# Altium footprint library AI.PcbLib: 137 footprints (part 6 of 9)
Each footprint in its own frame and in the unit in brackets; x right, y up, seen from the top. Pads: shape width x height; smd on the part's side, far side on the other; paste and mask are expansions set on the pad; w line width, h text height; cw(c..) or ccw(c..) is an arc to the next point about the centre after c.
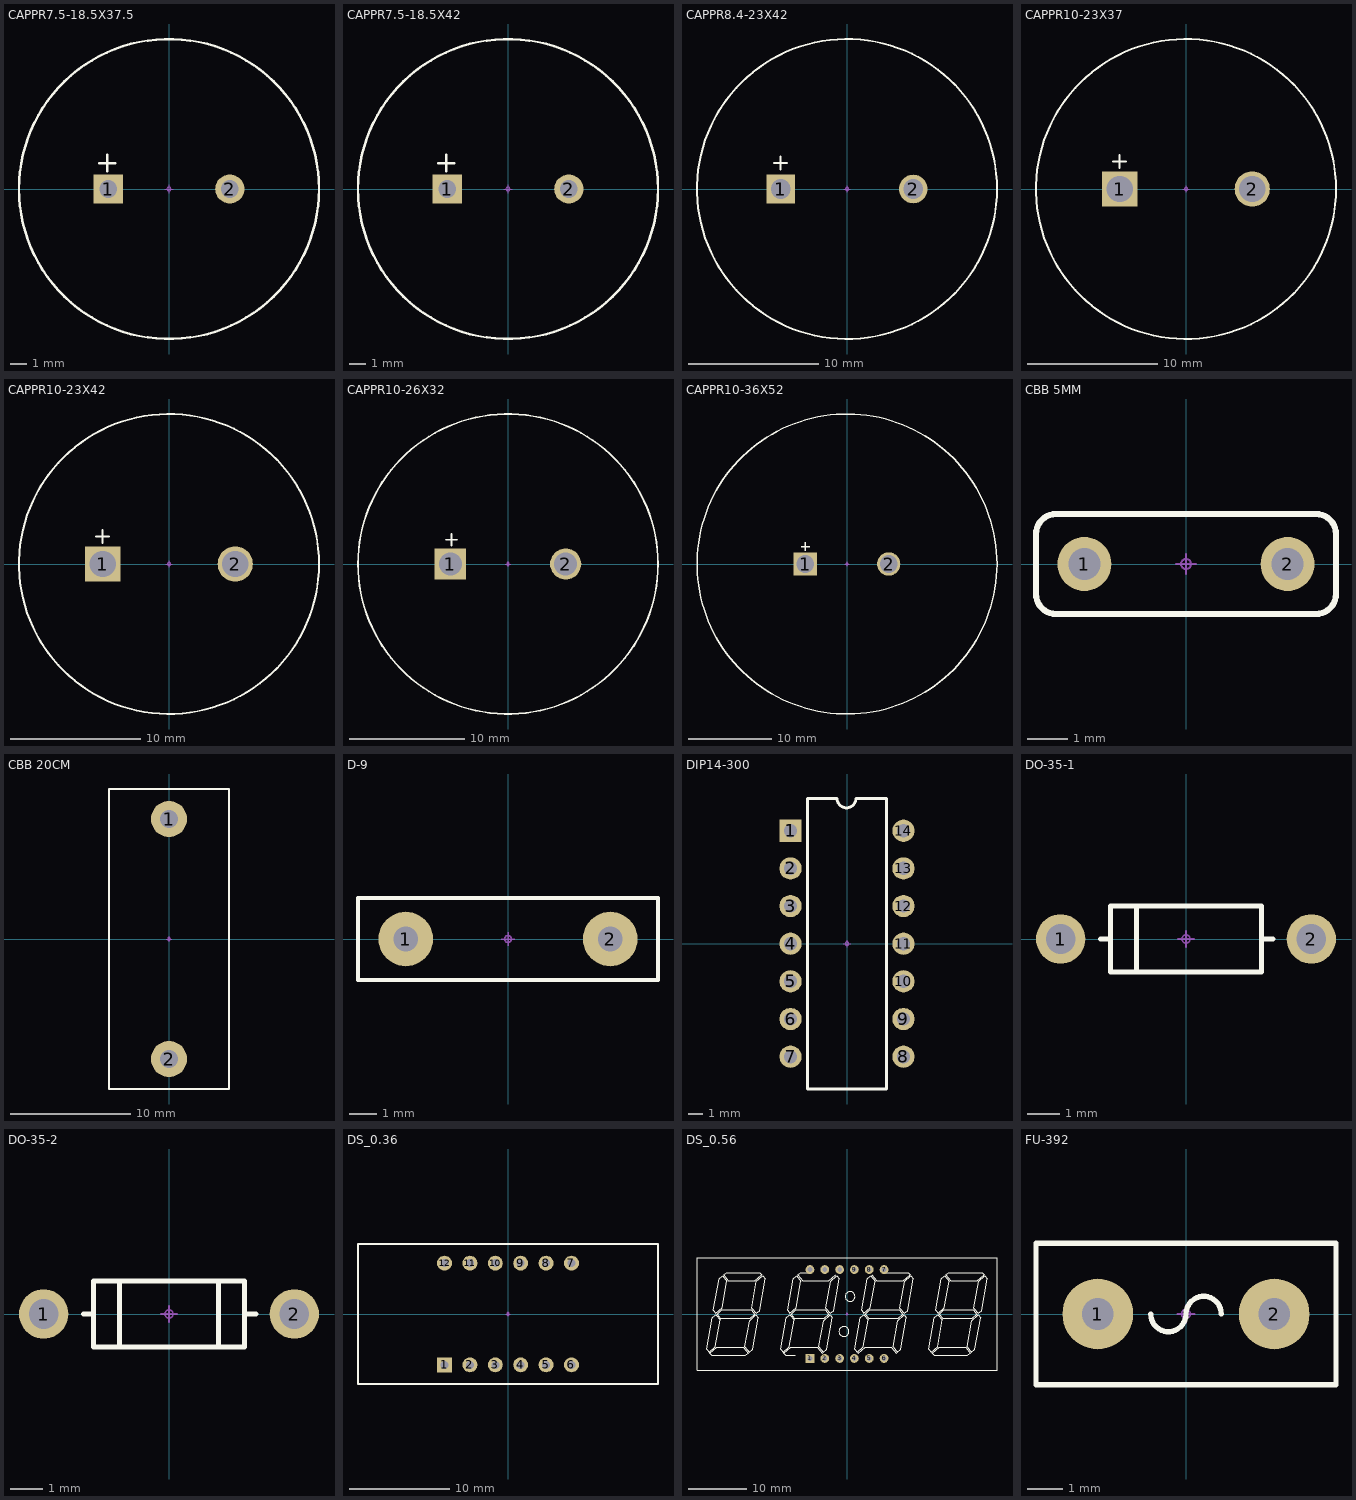
[diagram p5: the footprints below, top view; thin cyan lines are the x and y axes]

## CAPPR7.5-18.5X37.5 [mm]
pads (2):
  rect 1.8x1.8 hole 1.1: 1(-3.75,0)
  round 1.8 hole 1.1: 2(3.75,0)
Top Overlay:
  circle w0.152: c0,0 r9.25
  lines w0.152: -4.3,1.6 -3.3,1.6 ; -3.8,1.1 -3.8,2.1
Mechanical 15:
  circle w0.05: c0,0 r0.125
  lines w0.05: -0.25,0 0.25,0 ; 0,-0.25 0,0.25
3D body "CAPPR750-1850X3750.stp": height 37.5, standoff -3.6, extent -9.25,-9.25 9.25,9.25

## CAPPR7.5-18.5X42 [mm]
pads (2):
  rect 1.8x1.8 hole 1.1: 1(-3.75,0)
  round 1.8 hole 1.1: 2(3.75,0)
Top Overlay:
  circle w0.152: c0,0 r9.25
  lines w0.152: -4.3,1.6 -3.3,1.6 ; -3.8,1.1 -3.8,2.1
Mechanical 15:
  circle w0.05: c0,0 r0.125
  lines w0.05: -0.25,0 0.25,0 ; 0,-0.25 0,0.25
3D body "CAPPR750-1850X4200.stp": height 42, standoff -3.6, extent -9.25,-9.226 9.25,9.274

## CAPPR8.4-23X42 [mm]
pads (2):
  rect 2.2x2.2 hole 1.5: 1(-5.08,0)
  round 2.2 hole 1.5: 2(5.08,0)
Top Overlay:
  circle w0.152: c0,0 r11.5
  lines w0.152: -5.6,2 -4.6,2 ; -5.1,1.5 -5.1,2.5
Mechanical 15:
  circle w0.05: c0,0 r0.125
  lines w0.05: -0.25,0 0.25,0 ; 0,-0.25 0,0.25
3D body "CAPPR1000-2300X4200.stp": height 42, standoff -4, extent -11.5,-11.5 11.5,11.5

## CAPPR10-23X37 [mm]
pads (2):
  rect 2.7x2.7 hole 2: 1(-5.08,0)
  round 2.7 hole 2: 2(5.08,0)
Top Overlay:
  circle w0.152: c0,0 r11.5
  lines w0.152: -5.6,2.1 -4.6,2.1 ; -5.1,1.6 -5.1,2.6
Mechanical 15:
  circle w0.05: c0,0 r0.125
  lines w0.05: -0.25,0 0.25,0 ; 0,-0.25 0,0.25
3D body "CAPPR1000-2300X3700.stp": height 37, standoff -4, extent -11.5,-11.5 11.5,11.5

## CAPPR10-23X42 [mm]
pads (2):
  rect 2.7x2.7 hole 2: 1(-5.08,0)
  round 2.7 hole 2: 2(5.08,0)
Top Overlay:
  circle w0.152: c0,0 r11.5
  lines w0.152: -5.6,2.1 -4.6,2.1 ; -5.1,1.6 -5.1,2.6
Mechanical 15:
  circle w0.05: c0,0 r0.125
  lines w0.05: -0.25,0 0.25,0 ; 0,-0.25 0,0.25
3D body "CAPPR1000-2300X4200.stp": height 42, standoff -4, extent -11.5,-11.5 11.5,11.5

## CAPPR10-26X32 [mm]
pads (2):
  rect 2.7x2.7 hole 2: 1(-5,0)
  round 2.7 hole 2: 2(5,0)
Top Overlay:
  circle w0.152: c0,0 r13
  lines w0.152: -5.4,2.1 -4.4,2.1 ; -4.9,1.6 -4.9,2.6
Mechanical 15:
  circle w0.05: c0,0 r0.125
  lines w0.05: -0.25,0 0.25,0 ; 0,-0.25 0,0.25
3D body "CAPPR1000-2600X3200.stp": height 32, standoff -4, extent -13,-13 13,13

## CAPPR10-36X52 [mm]
pads (2):
  rect 2.8x2.8 hole 2.1: 1(-5,0)
  round 2.8 hole 2.1: 2(5,0)
Top Overlay:
  circle w0.152: c0,0 r18
  lines w0.152: -5.5,2.1 -4.5,2.1 ; -5,1.6 -5,2.6
Mechanical 15:
  circle w0.05: c0,0 r0.125
  lines w0.05: -0.25,0 0.25,0 ; 0,-0.25 0,0.25
3D body "CAPPR1000-3600X5200.stp": height 52, standoff -4, extent -18,-18 18,18

## CBB 5MM [mm]
pads (2):
  round 1.35 hole 0.8: 1(-2.54,0) 2(2.54,0)
Top Overlay:
  lines w0.152: -3.75,-0.75 ccw(c-3.25,-0.75) -3.25,-1.25 3.25,-1.25 ccw(c3.25,-0.75) 3.75,-0.75 3.75,0.75 ccw(c3.25,0.75) 3.25,1.25 -3.25,1.25 ccw(c-3.25,0.75) -3.75,0.75 -3.75,-0.75
Mechanical 15:
  circle w0.05: c0,0 r0.125
  lines w0.05: -0.25,0 0.25,0 ; 0,-0.25 0,0.25
3D body "CAPRR508-250X750X700.stp": height 7, standoff -1.94, extent -3.75,-1.25 3.75,1.25

## CBB 20CM [mm]
pads (2):
  round 3 hole 1.5: 1(0,10) 2(0,-10)
Top Overlay:
  lines w0.127: -5,-12.5 -5,12.5 5,12.5 5,-12.5 -5,-12.5
Mechanical 15:
  circle w0.05: c0,0 r0.125
  lines w0.05: -0.25,0 0.25,0 ; 0,-0.25 0,0.25
3D body "User Library-CBB81_W26_0_H19_0_T11_0_P22_0.STEP": height 22, standoff -10, extent -5.5,-13 5.5,13

## D-9 [mm]
pads (2):
  round 2 hole 0.9: 1(-3.75,0) 2(3.75,0)
Top Overlay:
  lines w0.152: -5.5,-1.5 -5.5,1.5 5.5,1.5 5.5,-1.5 -5.5,-1.5
Mechanical 15:
  circle w0.05: c0,0 r0.125
  lines w0.05: -0.25,0 0.25,0 ; 0,-0.25 0,0.25
3D body "User Library-final MOV7,5.STEP": height 16.5, standoff -2, extent -5.5,-0.9 5.801,0.95

## DIP14-300 [mm]
pads (14):
  rect 1.5x1.5 hole 0.9: 1(-3.81,7.62)
  round 1.5 hole 0.9: 2(-3.81,5.08) 3(-3.81,2.54) 4(-3.81,0) 5(-3.81,-2.54) 6(-3.81,-5.08) 7(-3.81,-7.62) 8(3.81,-7.62) 9(3.81,-5.08) 10(3.81,-2.54) 11(3.81,0) 12(3.81,2.54) 13(3.81,5.08) 14(3.81,7.62)
Top Overlay:
  lines w0.2: -0.685,9.8 -2.65,9.8 -2.65,-9.8 2.65,-9.8 2.65,9.8 ; -0.67,9.8 ccw(c-0.035,9.8) 0.6,9.8 2.615,9.8
Mechanical 15:
  circle w0.05: c0,0 r0.125
  lines w0.05: -0.25,0 0.25,0 ; 0,-0.25 0,0.25
3D body "DIP14-300.stp": height 5.33, standoff -3.3, extent -3.935,-9.845 3.935,9.845

## DO-35-1 [mm]
pads (2):
  round 1.5 hole 0.9: 1(-3.81,0) 2(3.81,0)
Top Overlay:
  lines w0.152: -2.6,0 -2.35,0 ; -1.5,-1 -1.5,1 ; 2.4,0 2.65,0 ; -2.298,-1 -2.298,1 2.3,1 2.3,-1 -2.298,-1
Mechanical 15:
  circle w0.05: c0,0 r0.125
  lines w0.05: -0.25,0 0.25,0 ; 0,-0.25 0,0.25
3D body "v150-090.stp": height 0.02, standoff -1.65, extent 3.06,-0.75 4.56,0.75
3D body "v150-090.stp": height 0.02, standoff -1.65, extent -4.56,-0.75 -3.06,0.75
3D body "DO-35.stp": height 1.91, standoff -3, extent -4.076,-0.955 4.077,0.955

## DO-35-2 [mm]
pads (2):
  round 1.5 hole 0.9: 1(-3.81,0) 2(3.81,0)
Top Overlay:
  lines w0.152: -2.6,0 -2.35,0 ; -1.5,-1 -1.5,1 ; 1.5,-1 1.5,1 ; 2.4,0 2.65,0 ; -2.298,-1 -2.298,1 2.3,1 2.3,-1 -2.298,-1
Mechanical 15:
  circle w0.05: c0,0 r0.125
  lines w0.05: -0.25,0 0.25,0 ; 0,-0.25 0,0.25
3D body "v150-090.stp": height 0.02, standoff -1.65, extent 3.06,-0.75 4.56,0.75
3D body "v150-090.stp": height 0.02, standoff -1.65, extent -4.56,-0.75 -3.06,0.75
3D body "DO-35.stp": height 1.91, standoff -3, extent -4.076,-0.955 4.077,0.955

## DS_0.36 [mm]
pads (12):
  rect 1.5x1.5 hole 0.8: 1(-6.35,-5.08)
  round 1.5 hole 0.8: 2(-3.81,-5.08) 3(-1.27,-5.08) 4(1.27,-5.08) 5(3.81,-5.08) 6(6.35,-5.08) 7(6.35,5.08) 8(3.81,5.08) 9(1.27,5.08) 10(-1.27,5.08) 11(-3.81,5.08) 12(-6.35,5.08)
Top Overlay:
  lines w0.152: -15,-7 -15,7 15,7 15,-7 -15,-7
Mechanical 15:
  circle w0.05: c0,0 r0.125
  lines w0.05: -0.25,0 0.25,0 ; 0,-0.25 0,0.25

## DS_0.56 [mm]
pads (12):
  rect 1.5x1.5 hole 0.8: 1(-6.35,-7.62)
  round 1.5 hole 0.8: 2(-3.81,-7.62) 3(-1.27,-7.62) 4(1.27,-7.62) 5(3.81,-7.62) 6(6.35,-7.62) 7(6.35,7.62) 8(3.81,7.62) 9(1.27,7.62) 10(-1.27,7.62) 11(-3.81,7.62) 12(-6.35,7.62)
Top Overlay:
  drawing of 168 lines, arcs and shapes, not listed
Mechanical 15:
  circle w0.05: c0,0 r0.125
  circle w0.05: c0,0 r0.125
  lines w0.05: -0.25,0 0.25,0 -0.25,0 ; 0,-0.25 0,0.25 0,-0.25
3D body "4BIT_8SEG_LED.STEP": height 10, standoff 0, extent -26,-9.602 26,9.398

## FU-392 [mm]
pads (2):
  round 2 hole 0.9: 1(-2.5,0) 2(2.5,0)
Top Overlay:
  lines w0.152: -1,0 ccw(c-0.5,0) 0,0 cw(c0.5,0) 1,0 ; -4.25,-2 4.25,-2 4.25,2 -4.25,2 -4.25,-2
Mechanical 15:
  circle w0.05: c0,0 r0.125
  lines w0.05: -0.25,0 0.25,0 ; 0,-0.25 0,0.25
3D body "c.stp": height 7.7, standoff -4.3, extent -4,-2 4,2